# Altium integrated library Weidmueller_OMNIMATE_Power.IntLib: 508 symbols (part 2 of 9) (continued)
## 1047690000 (continued)
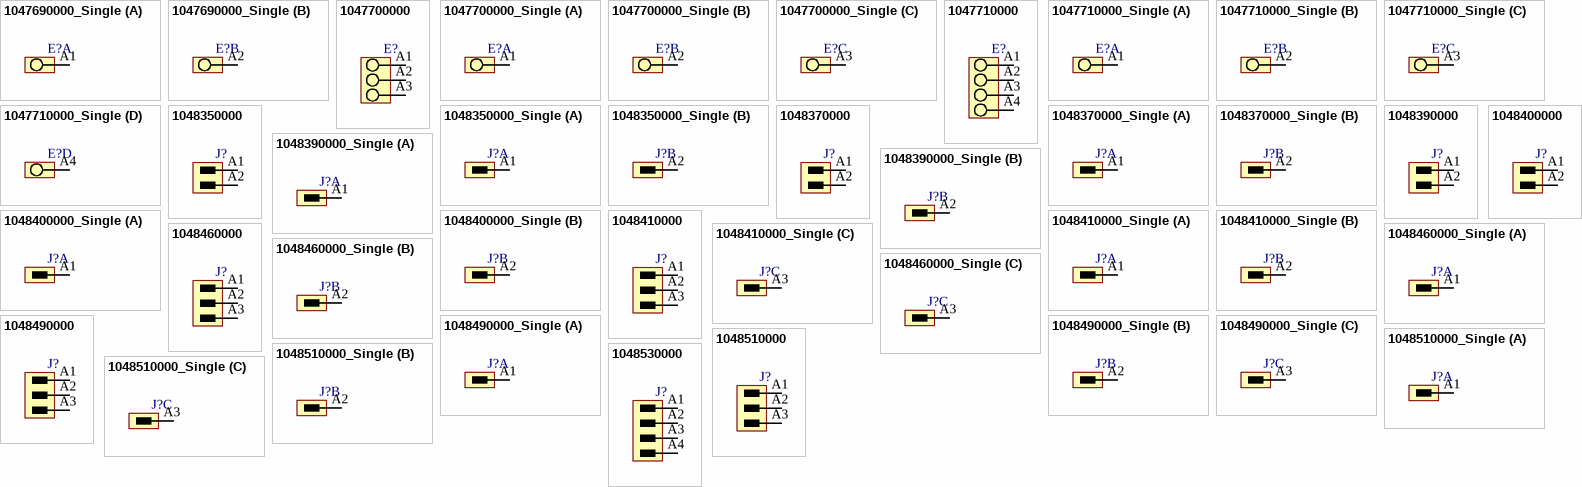
[diagram p4: symbols 1047690000_Single to 1048530000]

## 1047690000_Single
designator E?
OMNIMATE Power - series LXXX; PartNumber: 1047690000; Manufacturer: Weidmueller; Short_text_for_material: LXXX 15.00/02/90FR 4.5SN GY BX; Side_termination_characteristic: Flange right; Mounting_onto_the_PCB: Solder connection; Pitch_mm: 15 mm; Pitch_inch: 0,591 inch; No_of_poles: 2; Solder_pin_length_mm: 4,5 mm; Contact_material: Cu-Leg; Contact_surface: tinned; Insulating_material: Wemid (PA); UL_94_flammability_rating: V-0; Rated_voltage_for_surge_voltage_class_pollution_degree_II_2: 1000 V; Rated_current_min_no_of_poles_TU_20_deg_C: 150 A; Solid_min_H05_07_V_U: 0,5 mm²; Solid_max_H05_07_V_U: 16 mm²; Rated_voltage_use_group_B_UL_1059: 600 V; Rated_current_use_group_B_UL_1059: 127 A; Wire_cross_section_AWG_min_UL_1059: AWG 20; Wire_cross_section_AWG_max_UL_1059: AWG 1; PackageReference: LXXX_15_00_90FR_02; Colour: Pebble grey; Packaging: Box; Qty: 20 PCS; Revision: V1; ComponentLink1Description: Manufacturer URL; ComponentLink1URL: http://www.weidmueller.com/; ComponentLink2Description: URL Link1; ComponentLink2URL: http://catalog.weidmueller.com/catalog/Start.do?localeId=en&ObjectID=1047690000
footprint LXXX_15_00_90FR_02 (OMNIMATE Power - Serie LXXX  LXXX 15.00/02/90FR 4.5)
part A pins: A1
part B pins: A2
1 alternate drawing of the same symbol

## 1047700000
designator E?
OMNIMATE Power - series LXXX; PartNumber: 1047700000; Manufacturer: Weidmueller; Short_text_for_material: LXXX 15.00/03/90FR 4.5SN GY BX; Side_termination_characteristic: Flange right; Mounting_onto_the_PCB: Solder connection; Pitch_mm: 15 mm; Pitch_inch: 0,591 inch; No_of_poles: 3; Solder_pin_length_mm: 4,5 mm; Contact_material: Cu-Leg; Contact_surface: tinned; Insulating_material: Wemid (PA); UL_94_flammability_rating: V-0; Rated_voltage_for_surge_voltage_class_pollution_degree_II_2: 1000 V; Rated_current_min_no_of_poles_TU_20_deg_C: 150 A; Solid_min_H05_07_V_U: 0,5 mm²; Solid_max_H05_07_V_U: 16 mm²; Rated_voltage_use_group_B_UL_1059: 600 V; Rated_current_use_group_B_UL_1059: 127 A; Wire_cross_section_AWG_min_UL_1059: AWG 20; Wire_cross_section_AWG_max_UL_1059: AWG 1; PackageReference: LXXX_15_00_90FR_03; Colour: Pebble grey; Packaging: Box; Qty: 10 PCS; Revision: V1; ComponentLink1Description: Manufacturer URL; ComponentLink1URL: http://www.weidmueller.com/; ComponentLink2Description: URL Link1; ComponentLink2URL: http://catalog.weidmueller.com/catalog/Start.do?localeId=en&ObjectID=1047700000
footprint LXXX_15_00_90FR_03 (OMNIMATE Power - Serie LXXX  LXXX 15.00/03/90FR 4.5)
pins: A1, A2, A3
1 alternate drawing of the same symbol

## 1047700000_Single
designator E?
OMNIMATE Power - series LXXX; PartNumber: 1047700000; Manufacturer: Weidmueller; Short_text_for_material: LXXX 15.00/03/90FR 4.5SN GY BX; Side_termination_characteristic: Flange right; Mounting_onto_the_PCB: Solder connection; Pitch_mm: 15 mm; Pitch_inch: 0,591 inch; No_of_poles: 3; Solder_pin_length_mm: 4,5 mm; Contact_material: Cu-Leg; Contact_surface: tinned; Insulating_material: Wemid (PA); UL_94_flammability_rating: V-0; Rated_voltage_for_surge_voltage_class_pollution_degree_II_2: 1000 V; Rated_current_min_no_of_poles_TU_20_deg_C: 150 A; Solid_min_H05_07_V_U: 0,5 mm²; Solid_max_H05_07_V_U: 16 mm²; Rated_voltage_use_group_B_UL_1059: 600 V; Rated_current_use_group_B_UL_1059: 127 A; Wire_cross_section_AWG_min_UL_1059: AWG 20; Wire_cross_section_AWG_max_UL_1059: AWG 1; PackageReference: LXXX_15_00_90FR_03; Colour: Pebble grey; Packaging: Box; Qty: 10 PCS; Revision: V1; ComponentLink1Description: Manufacturer URL; ComponentLink1URL: http://www.weidmueller.com/; ComponentLink2Description: URL Link1; ComponentLink2URL: http://catalog.weidmueller.com/catalog/Start.do?localeId=en&ObjectID=1047700000
footprint LXXX_15_00_90FR_03 (OMNIMATE Power - Serie LXXX  LXXX 15.00/03/90FR 4.5)
part A pins: A1
part B pins: A2
part C pins: A3
1 alternate drawing of the same symbol

## 1047710000
designator E?
OMNIMATE Power - series LXXX; PartNumber: 1047710000; Manufacturer: Weidmueller; Short_text_for_material: LXXX 15.00/04/90FR 4.5SN GY BX; Side_termination_characteristic: Flange right; Mounting_onto_the_PCB: Solder connection; Pitch_mm: 15 mm; Pitch_inch: 0,591 inch; No_of_poles: 4; Solder_pin_length_mm: 4,5 mm; Contact_material: Cu-Leg; Contact_surface: tinned; Insulating_material: Wemid (PA); UL_94_flammability_rating: V-0; Rated_voltage_for_surge_voltage_class_pollution_degree_II_2: 1000 V; Rated_current_min_no_of_poles_TU_20_deg_C: 150 A; Solid_min_H05_07_V_U: 0,5 mm²; Solid_max_H05_07_V_U: 16 mm²; Rated_voltage_use_group_B_UL_1059: 600 V; Rated_current_use_group_B_UL_1059: 127 A; Wire_cross_section_AWG_min_UL_1059: AWG 20; Wire_cross_section_AWG_max_UL_1059: AWG 1; PackageReference: LXXX_15_00_90FR_04; Colour: Pebble grey; Packaging: Box; Qty: 10 PCS; Revision: V1; ComponentLink1Description: Manufacturer URL; ComponentLink1URL: http://www.weidmueller.com/; ComponentLink2Description: URL Link1; ComponentLink2URL: http://catalog.weidmueller.com/catalog/Start.do?localeId=en&ObjectID=1047710000
footprint LXXX_15_00_90FR_04 (OMNIMATE Power - Serie LXXX  LXXX 15.00/04/90FR 4.5)
pins: A1, A2, A3, A4
1 alternate drawing of the same symbol

## 1047710000_Single
designator E?
OMNIMATE Power - series LXXX; PartNumber: 1047710000; Manufacturer: Weidmueller; Short_text_for_material: LXXX 15.00/04/90FR 4.5SN GY BX; Side_termination_characteristic: Flange right; Mounting_onto_the_PCB: Solder connection; Pitch_mm: 15 mm; Pitch_inch: 0,591 inch; No_of_poles: 4; Solder_pin_length_mm: 4,5 mm; Contact_material: Cu-Leg; Contact_surface: tinned; Insulating_material: Wemid (PA); UL_94_flammability_rating: V-0; Rated_voltage_for_surge_voltage_class_pollution_degree_II_2: 1000 V; Rated_current_min_no_of_poles_TU_20_deg_C: 150 A; Solid_min_H05_07_V_U: 0,5 mm²; Solid_max_H05_07_V_U: 16 mm²; Rated_voltage_use_group_B_UL_1059: 600 V; Rated_current_use_group_B_UL_1059: 127 A; Wire_cross_section_AWG_min_UL_1059: AWG 20; Wire_cross_section_AWG_max_UL_1059: AWG 1; PackageReference: LXXX_15_00_90FR_04; Colour: Pebble grey; Packaging: Box; Qty: 10 PCS; Revision: V1; ComponentLink1Description: Manufacturer URL; ComponentLink1URL: http://www.weidmueller.com/; ComponentLink2Description: URL Link1; ComponentLink2URL: http://catalog.weidmueller.com/catalog/Start.do?localeId=en&ObjectID=1047710000
footprint LXXX_15_00_90FR_04 (OMNIMATE Power - Serie LXXX  LXXX 15.00/04/90FR 4.5)
part A pins: A1
part B pins: A2
part C pins: A3
part D pins: A4
1 alternate drawing of the same symbol

## 1048350000
designator J?
OMNIMATE Power - series BV/SV 7.62HP; PartNumber: 1048350000; Manufacturer: Weidmueller; Short_text_for_material: SV 7.62HP/02/180MF2 3.5SN BK BX; Side_termination_characteristic: closed side; Note: Middle flange; Mounting_onto_the_PCB: Solder connection; Pitch_mm: 7.62 mm; Pitch_inch: 0.3 inch; No_of_poles: 2; Outgoing_elbow: 180°; Solder_pin_length_mm: 3.5 mm; Contact_material: Cu-Leg; Contact_surface: tinned; Insulating_material: PA GF; UL_94_flammability_rating: V-0; Rated_voltage_for_surge_voltage_class_pollution_degree_II_2: 1000 V; Rated_voltage_use_group_B_UL_1059: 300 V; Rated_current_use_group_B_UL_1059: 40.5 A; PackageReference: SV_7_62HP_180MF_02; Colour: Black; Packaging: Box; Qty: 78 PCS; Revision: V1; ComponentLink1Description: Manufacturer URL; ComponentLink1URL: http://www.weidmueller.com/; ComponentLink2Description: URL Link1; ComponentLink2URL: http://catalog.weidmueller.com/catalog/Start.do?localeId=en&ObjectID=1048350000
footprint SV_7_62HP_180MF_02 (OMNIMATE Power - Serie BV/SV 7.62HP  SV 7.62HP/02/180MF3 3.5)
pins: A1, A2

## 1048350000_Single
designator J?
OMNIMATE Power - series BV/SV 7.62HP; PartNumber: 1048350000; Manufacturer: Weidmueller; Short_text_for_material: SV 7.62HP/02/180MF2 3.5SN BK BX; Side_termination_characteristic: closed side; Note: Middle flange; Mounting_onto_the_PCB: Solder connection; Pitch_mm: 7.62 mm; Pitch_inch: 0.3 inch; No_of_poles: 2; Outgoing_elbow: 180°; Solder_pin_length_mm: 3.5 mm; Contact_material: Cu-Leg; Contact_surface: tinned; Insulating_material: PA GF; UL_94_flammability_rating: V-0; Rated_voltage_for_surge_voltage_class_pollution_degree_II_2: 1000 V; Rated_voltage_use_group_B_UL_1059: 300 V; Rated_current_use_group_B_UL_1059: 40.5 A; PackageReference: SV_7_62HP_180MF_02; Colour: Black; Packaging: Box; Qty: 78 PCS; Revision: V1; ComponentLink1Description: Manufacturer URL; ComponentLink1URL: http://www.weidmueller.com/; ComponentLink2Description: URL Link1; ComponentLink2URL: http://catalog.weidmueller.com/catalog/Start.do?localeId=en&ObjectID=1048350000
footprint SV_7_62HP_180MF_02 (OMNIMATE Power - Serie BV/SV 7.62HP  SV 7.62HP/02/180MF3 3.5)
part A pins: A1
part B pins: A2

## 1048370000
designator J?
OMNIMATE Power - series BV/SV 7.62HP; PartNumber: 1048370000; Manufacturer: Weidmueller; Short_text_for_material: SV 7.62HP/02/270MF2 3.5SN BK BX; Side_termination_characteristic: closed side; Note: Middle flange; Mounting_onto_the_PCB: Solder connection; Pitch_mm: 7.62 mm; Pitch_inch: 0.3 inch; No_of_poles: 2; Outgoing_elbow: 270°; Solder_pin_length_mm: 3.5 mm; Contact_material: Cu-Leg; Contact_surface: tinned; Insulating_material: PA GF; UL_94_flammability_rating: V-0; Rated_voltage_for_surge_voltage_class_pollution_degree_II_2: 1000 V; Rated_voltage_use_group_B_UL_1059: 300 V; Rated_current_use_group_B_UL_1059: 40.5 A; PackageReference: SV_7_62HP_270MF_02; Colour: Black; Packaging: Box; Qty: 78 PCS; Revision: V1; ComponentLink1Description: Manufacturer URL; ComponentLink1URL: http://www.weidmueller.com/; ComponentLink2Description: URL Link1; ComponentLink2URL: http://catalog.weidmueller.com/catalog/Start.do?localeId=en&ObjectID=1048370000
footprint SV_7_62HP_270MF_02 (OMNIMATE Power - Serie BV/SV 7.62HP  SV 7.62HP/02/270MF3 3.5)
pins: A1, A2

## 1048370000_Single
designator J?
OMNIMATE Power - series BV/SV 7.62HP; PartNumber: 1048370000; Manufacturer: Weidmueller; Short_text_for_material: SV 7.62HP/02/270MF2 3.5SN BK BX; Side_termination_characteristic: closed side; Note: Middle flange; Mounting_onto_the_PCB: Solder connection; Pitch_mm: 7.62 mm; Pitch_inch: 0.3 inch; No_of_poles: 2; Outgoing_elbow: 270°; Solder_pin_length_mm: 3.5 mm; Contact_material: Cu-Leg; Contact_surface: tinned; Insulating_material: PA GF; UL_94_flammability_rating: V-0; Rated_voltage_for_surge_voltage_class_pollution_degree_II_2: 1000 V; Rated_voltage_use_group_B_UL_1059: 300 V; Rated_current_use_group_B_UL_1059: 40.5 A; PackageReference: SV_7_62HP_270MF_02; Colour: Black; Packaging: Box; Qty: 78 PCS; Revision: V1; ComponentLink1Description: Manufacturer URL; ComponentLink1URL: http://www.weidmueller.com/; ComponentLink2Description: URL Link1; ComponentLink2URL: http://catalog.weidmueller.com/catalog/Start.do?localeId=en&ObjectID=1048370000
footprint SV_7_62HP_270MF_02 (OMNIMATE Power - Serie BV/SV 7.62HP  SV 7.62HP/02/270MF3 3.5)
part A pins: A1
part B pins: A2

## 1048390000
designator J?
OMNIMATE Power - series BV/SV 7.62HP; PartNumber: 1048390000; Manufacturer: Weidmueller; Short_text_for_material: SV 7.62HP/02/90MF2 3.5SN BK BX; Side_termination_characteristic: closed side; Note: Middle flange; Mounting_onto_the_PCB: Solder connection; Pitch_mm: 7.62 mm; Pitch_inch: 0.3 inch; No_of_poles: 2; Outgoing_elbow: 90°; Solder_pin_length_mm: 3.5 mm; Contact_material: Cu-Leg; Contact_surface: tinned; Insulating_material: PA GF; UL_94_flammability_rating: V-0; Rated_voltage_for_surge_voltage_class_pollution_degree_II_2: 1000 V; Rated_voltage_use_group_B_UL_1059: 300 V; Rated_current_use_group_B_UL_1059: 40.5 A; PackageReference: SV_7_62HP_90MF_02; Colour: Black; Packaging: Box; Qty: 78 PCS; Revision: V1; ComponentLink1Description: Manufacturer URL; ComponentLink1URL: http://www.weidmueller.com/; ComponentLink2Description: URL Link1; ComponentLink2URL: http://catalog.weidmueller.com/catalog/Start.do?localeId=en&ObjectID=1048390000
footprint SV_7_62HP_90MF_02 (OMNIMATE Power - Serie BV/SV 7.62HP  SV 7.62HP/02/90MF3 3.5)
pins: A1, A2

## 1048390000_Single
designator J?
OMNIMATE Power - series BV/SV 7.62HP; PartNumber: 1048390000; Manufacturer: Weidmueller; Short_text_for_material: SV 7.62HP/02/90MF2 3.5SN BK BX; Side_termination_characteristic: closed side; Note: Middle flange; Mounting_onto_the_PCB: Solder connection; Pitch_mm: 7.62 mm; Pitch_inch: 0.3 inch; No_of_poles: 2; Outgoing_elbow: 90°; Solder_pin_length_mm: 3.5 mm; Contact_material: Cu-Leg; Contact_surface: tinned; Insulating_material: PA GF; UL_94_flammability_rating: V-0; Rated_voltage_for_surge_voltage_class_pollution_degree_II_2: 1000 V; Rated_voltage_use_group_B_UL_1059: 300 V; Rated_current_use_group_B_UL_1059: 40.5 A; PackageReference: SV_7_62HP_90MF_02; Colour: Black; Packaging: Box; Qty: 78 PCS; Revision: V1; ComponentLink1Description: Manufacturer URL; ComponentLink1URL: http://www.weidmueller.com/; ComponentLink2Description: URL Link1; ComponentLink2URL: http://catalog.weidmueller.com/catalog/Start.do?localeId=en&ObjectID=1048390000
footprint SV_7_62HP_90MF_02 (OMNIMATE Power - Serie BV/SV 7.62HP  SV 7.62HP/02/90MF3 3.5)
part A pins: A1
part B pins: A2

## 1048400000
designator J?
OMNIMATE Power - series BV/SV 7.62HP; PartNumber: 1048400000; Manufacturer: Weidmueller; Short_text_for_material: SV 7.62HP/02/90MSF 3.5SN BK BX; Side_termination_characteristic: closed side; Note: Middle screw flange; Mounting_onto_the_PCB: Solder connection; Pitch_mm: 7.62 mm; Pitch_inch: 0.3 inch; No_of_poles: 2; Outgoing_elbow: 90°; Solder_pin_length_mm: 3.5 mm; Contact_material: Cu-Leg; Contact_surface: tinned; Insulating_material: PA GF; UL_94_flammability_rating: V-0; Rated_voltage_for_surge_voltage_class_pollution_degree_II_2: 1000 V; Rated_voltage_use_group_B_UL_1059: 300 V; Rated_current_use_group_B_UL_1059: 40.5 A; PackageReference: SV_7_62HP_90MSF_02; Colour: Black; Packaging: Box; Qty: 78 PCS; Revision: V1; ComponentLink1Description: Manufacturer URL; ComponentLink1URL: http://www.weidmueller.com/; ComponentLink2Description: URL Link1; ComponentLink2URL: http://catalog.weidmueller.com/catalog/Start.do?localeId=en&ObjectID=1048400000
footprint SV_7_62HP_90MSF_02 (OMNIMATE Power - Serie BV/SV 7.62HP  SV 7.62HP/02/90MSF3 3.5)
pins: A1, A2

## 1048400000_Single
designator J?
OMNIMATE Power - series BV/SV 7.62HP; PartNumber: 1048400000; Manufacturer: Weidmueller; Short_text_for_material: SV 7.62HP/02/90MSF 3.5SN BK BX; Side_termination_characteristic: closed side; Note: Middle screw flange; Mounting_onto_the_PCB: Solder connection; Pitch_mm: 7.62 mm; Pitch_inch: 0.3 inch; No_of_poles: 2; Outgoing_elbow: 90°; Solder_pin_length_mm: 3.5 mm; Contact_material: Cu-Leg; Contact_surface: tinned; Insulating_material: PA GF; UL_94_flammability_rating: V-0; Rated_voltage_for_surge_voltage_class_pollution_degree_II_2: 1000 V; Rated_voltage_use_group_B_UL_1059: 300 V; Rated_current_use_group_B_UL_1059: 40.5 A; PackageReference: SV_7_62HP_90MSF_02; Colour: Black; Packaging: Box; Qty: 78 PCS; Revision: V1; ComponentLink1Description: Manufacturer URL; ComponentLink1URL: http://www.weidmueller.com/; ComponentLink2Description: URL Link1; ComponentLink2URL: http://catalog.weidmueller.com/catalog/Start.do?localeId=en&ObjectID=1048400000
footprint SV_7_62HP_90MSF_02 (OMNIMATE Power - Serie BV/SV 7.62HP  SV 7.62HP/02/90MSF3 3.5)
part A pins: A1
part B pins: A2

## 1048410000
designator J?
OMNIMATE Power - series BV/SV 7.62HP; PartNumber: 1048410000; Manufacturer: Weidmueller; Short_text_for_material: SV 7.62HP/03/180MF2 3.5SN BK BX; Side_termination_characteristic: closed side; Note: Middle flange; Mounting_onto_the_PCB: Solder connection; Pitch_mm: 7.62 mm; Pitch_inch: 0.3 inch; No_of_poles: 3; Outgoing_elbow: 180°; Solder_pin_length_mm: 3.5 mm; Contact_material: Cu-Leg; Contact_surface: tinned; Insulating_material: PA GF; UL_94_flammability_rating: V-0; Rated_voltage_for_surge_voltage_class_pollution_degree_II_2: 1000 V; Rated_voltage_use_group_B_UL_1059: 300 V; Rated_current_use_group_B_UL_1059: 40.5 A; PackageReference: SV_7_62HP_180MF_03; Colour: Black; Packaging: Box; Qty: 60 PCS; Revision: V1; ComponentLink1Description: Manufacturer URL; ComponentLink1URL: http://www.weidmueller.com/; ComponentLink2Description: URL Link1; ComponentLink2URL: http://catalog.weidmueller.com/catalog/Start.do?localeId=en&ObjectID=1048410000
footprint SV_7_62HP_180MF_03 (OMNIMATE Power - Serie BV/SV 7.62HP  SV 7.62HP/03/180MF3 3.5)
pins: A1, A2, A3

## 1048410000_Single
designator J?
OMNIMATE Power - series BV/SV 7.62HP; PartNumber: 1048410000; Manufacturer: Weidmueller; Short_text_for_material: SV 7.62HP/03/180MF2 3.5SN BK BX; Side_termination_characteristic: closed side; Note: Middle flange; Mounting_onto_the_PCB: Solder connection; Pitch_mm: 7.62 mm; Pitch_inch: 0.3 inch; No_of_poles: 3; Outgoing_elbow: 180°; Solder_pin_length_mm: 3.5 mm; Contact_material: Cu-Leg; Contact_surface: tinned; Insulating_material: PA GF; UL_94_flammability_rating: V-0; Rated_voltage_for_surge_voltage_class_pollution_degree_II_2: 1000 V; Rated_voltage_use_group_B_UL_1059: 300 V; Rated_current_use_group_B_UL_1059: 40.5 A; PackageReference: SV_7_62HP_180MF_03; Colour: Black; Packaging: Box; Qty: 60 PCS; Revision: V1; ComponentLink1Description: Manufacturer URL; ComponentLink1URL: http://www.weidmueller.com/; ComponentLink2Description: URL Link1; ComponentLink2URL: http://catalog.weidmueller.com/catalog/Start.do?localeId=en&ObjectID=1048410000
footprint SV_7_62HP_180MF_03 (OMNIMATE Power - Serie BV/SV 7.62HP  SV 7.62HP/03/180MF3 3.5)
part A pins: A1
part B pins: A2
part C pins: A3

## 1048460000
designator J?
OMNIMATE Power - series BV/SV 7.62HP; PartNumber: 1048460000; Manufacturer: Weidmueller; Short_text_for_material: SV 7.62HP/03/270MF3 3.5SN BK BX; Side_termination_characteristic: closed side; Note: Middle flange; Mounting_onto_the_PCB: Solder connection; Pitch_mm: 7.62 mm; Pitch_inch: 0.3 inch; No_of_poles: 3; Outgoing_elbow: 270°; Solder_pin_length_mm: 3.5 mm; Contact_material: Cu-Leg; Contact_surface: tinned; Insulating_material: PA GF; UL_94_flammability_rating: V-0; Rated_voltage_for_surge_voltage_class_pollution_degree_II_2: 1000 V; Rated_voltage_use_group_B_UL_1059: 300 V; Rated_current_use_group_B_UL_1059: 40.5 A; PackageReference: SV_7_62HP_270MF_03; Colour: Black; Packaging: Box; Qty: 60 PCS; Revision: V1; ComponentLink1Description: Manufacturer URL; ComponentLink1URL: http://www.weidmueller.com/; ComponentLink2Description: URL Link1; ComponentLink2URL: http://catalog.weidmueller.com/catalog/Start.do?localeId=en&ObjectID=1048460000
footprint SV_7_62HP_270MF_03 (OMNIMATE Power - Serie BV/SV 7.62HP  SV 7.62HP/03/270MF3 3.5)
pins: A1, A2, A3

## 1048460000_Single
designator J?
OMNIMATE Power - series BV/SV 7.62HP; PartNumber: 1048460000; Manufacturer: Weidmueller; Short_text_for_material: SV 7.62HP/03/270MF3 3.5SN BK BX; Side_termination_characteristic: closed side; Note: Middle flange; Mounting_onto_the_PCB: Solder connection; Pitch_mm: 7.62 mm; Pitch_inch: 0.3 inch; No_of_poles: 3; Outgoing_elbow: 270°; Solder_pin_length_mm: 3.5 mm; Contact_material: Cu-Leg; Contact_surface: tinned; Insulating_material: PA GF; UL_94_flammability_rating: V-0; Rated_voltage_for_surge_voltage_class_pollution_degree_II_2: 1000 V; Rated_voltage_use_group_B_UL_1059: 300 V; Rated_current_use_group_B_UL_1059: 40.5 A; PackageReference: SV_7_62HP_270MF_03; Colour: Black; Packaging: Box; Qty: 60 PCS; Revision: V1; ComponentLink1Description: Manufacturer URL; ComponentLink1URL: http://www.weidmueller.com/; ComponentLink2Description: URL Link1; ComponentLink2URL: http://catalog.weidmueller.com/catalog/Start.do?localeId=en&ObjectID=1048460000
footprint SV_7_62HP_270MF_03 (OMNIMATE Power - Serie BV/SV 7.62HP  SV 7.62HP/03/270MF3 3.5)
part A pins: A1
part B pins: A2
part C pins: A3

## 1048490000
designator J?
OMNIMATE Power - series BV/SV 7.62HP; PartNumber: 1048490000; Manufacturer: Weidmueller; Short_text_for_material: SV 7.62HP/03/90MF2 3.5SN BK BX; Side_termination_characteristic: closed side; Note: Middle flange; Mounting_onto_the_PCB: Solder connection; Pitch_mm: 7.62 mm; Pitch_inch: 0.3 inch; No_of_poles: 3; Outgoing_elbow: 90°; Solder_pin_length_mm: 3.5 mm; Contact_material: Cu-Leg; Contact_surface: tinned; Insulating_material: PA GF; UL_94_flammability_rating: V-0; Rated_voltage_for_surge_voltage_class_pollution_degree_II_2: 1000 V; Rated_voltage_use_group_B_UL_1059: 300 V; Rated_current_use_group_B_UL_1059: 40.5 A; PackageReference: SV_7_62HP_90MF_03; Colour: Black; Packaging: Box; Qty: 60 PCS; Revision: V1; ComponentLink1Description: Manufacturer URL; ComponentLink1URL: http://www.weidmueller.com/; ComponentLink2Description: URL Link1; ComponentLink2URL: http://catalog.weidmueller.com/catalog/Start.do?localeId=en&ObjectID=1048490000
footprint SV_7_62HP_90MF_03 (OMNIMATE Power - Serie BV/SV 7.62HP  SV 7.62HP/03/90MF3 3.5)
pins: A1, A2, A3

## 1048490000_Single
designator J?
OMNIMATE Power - series BV/SV 7.62HP; PartNumber: 1048490000; Manufacturer: Weidmueller; Short_text_for_material: SV 7.62HP/03/90MF2 3.5SN BK BX; Side_termination_characteristic: closed side; Note: Middle flange; Mounting_onto_the_PCB: Solder connection; Pitch_mm: 7.62 mm; Pitch_inch: 0.3 inch; No_of_poles: 3; Outgoing_elbow: 90°; Solder_pin_length_mm: 3.5 mm; Contact_material: Cu-Leg; Contact_surface: tinned; Insulating_material: PA GF; UL_94_flammability_rating: V-0; Rated_voltage_for_surge_voltage_class_pollution_degree_II_2: 1000 V; Rated_voltage_use_group_B_UL_1059: 300 V; Rated_current_use_group_B_UL_1059: 40.5 A; PackageReference: SV_7_62HP_90MF_03; Colour: Black; Packaging: Box; Qty: 60 PCS; Revision: V1; ComponentLink1Description: Manufacturer URL; ComponentLink1URL: http://www.weidmueller.com/; ComponentLink2Description: URL Link1; ComponentLink2URL: http://catalog.weidmueller.com/catalog/Start.do?localeId=en&ObjectID=1048490000
footprint SV_7_62HP_90MF_03 (OMNIMATE Power - Serie BV/SV 7.62HP  SV 7.62HP/03/90MF3 3.5)
part A pins: A1
part B pins: A2
part C pins: A3

## 1048510000
designator J?
OMNIMATE Power - series BV/SV 7.62HP; PartNumber: 1048510000; Manufacturer: Weidmueller; Short_text_for_material: SV 7.62HP/03/90MSF2 3.5SN BK BX; Side_termination_characteristic: closed side; Note: Middle screw flange; Mounting_onto_the_PCB: Solder connection; Pitch_mm: 7.62 mm; Pitch_inch: 0.3 inch; No_of_poles: 3; Outgoing_elbow: 90°; Solder_pin_length_mm: 3.5 mm; Contact_material: Cu-Leg; Contact_surface: tinned; Insulating_material: PA GF; UL_94_flammability_rating: V-0; Rated_voltage_for_surge_voltage_class_pollution_degree_II_2: 1000 V; Rated_voltage_use_group_B_UL_1059: 300 V; Rated_current_use_group_B_UL_1059: 40.5 A; PackageReference: SV_7_62HP_90MSF_03; Colour: Black; Packaging: Box; Qty: 60 PCS; Revision: V1; ComponentLink1Description: Manufacturer URL; ComponentLink1URL: http://www.weidmueller.com/; ComponentLink2Description: URL Link1; ComponentLink2URL: http://catalog.weidmueller.com/catalog/Start.do?localeId=en&ObjectID=1048510000
footprint SV_7_62HP_90MSF_03 (OMNIMATE Power - Serie BV/SV 7.62HP  SV 7.62HP/03/90MSF3 3.5)
pins: A1, A2, A3

## 1048510000_Single
designator J?
OMNIMATE Power - series BV/SV 7.62HP; PartNumber: 1048510000; Manufacturer: Weidmueller; Short_text_for_material: SV 7.62HP/03/90MSF2 3.5SN BK BX; Side_termination_characteristic: closed side; Note: Middle screw flange; Mounting_onto_the_PCB: Solder connection; Pitch_mm: 7.62 mm; Pitch_inch: 0.3 inch; No_of_poles: 3; Outgoing_elbow: 90°; Solder_pin_length_mm: 3.5 mm; Contact_material: Cu-Leg; Contact_surface: tinned; Insulating_material: PA GF; UL_94_flammability_rating: V-0; Rated_voltage_for_surge_voltage_class_pollution_degree_II_2: 1000 V; Rated_voltage_use_group_B_UL_1059: 300 V; Rated_current_use_group_B_UL_1059: 40.5 A; PackageReference: SV_7_62HP_90MSF_03; Colour: Black; Packaging: Box; Qty: 60 PCS; Revision: V1; ComponentLink1Description: Manufacturer URL; ComponentLink1URL: http://www.weidmueller.com/; ComponentLink2Description: URL Link1; ComponentLink2URL: http://catalog.weidmueller.com/catalog/Start.do?localeId=en&ObjectID=1048510000
footprint SV_7_62HP_90MSF_03 (OMNIMATE Power - Serie BV/SV 7.62HP  SV 7.62HP/03/90MSF3 3.5)
part A pins: A1
part B pins: A2
part C pins: A3

## 1048530000
designator J?
OMNIMATE Power - series BV/SV 7.62HP; PartNumber: 1048530000; Manufacturer: Weidmueller; Short_text_for_material: SV 7.62HP/04/180MF3 3.5SN BK BX; Side_termination_characteristic: closed side; Note: Middle flange; Mounting_onto_the_PCB: Solder connection; Pitch_mm: 7.62 mm; Pitch_inch: 0.3 inch; No_of_poles: 4; Outgoing_elbow: 180°; Solder_pin_length_mm: 3.5 mm; Contact_material: Cu-Leg; Contact_surface: tinned; Insulating_material: PA GF; UL_94_flammability_rating: V-0; Rated_voltage_for_surge_voltage_class_pollution_degree_II_2: 1000 V; Rated_voltage_use_group_B_UL_1059: 300 V; Rated_current_use_group_B_UL_1059: 40.5 A; PackageReference: SV_7_62HP_180MF_04; Colour: Black; Packaging: Box; Qty: 48 PCS; Revision: V1; ComponentLink1Description: Manufacturer URL; ComponentLink1URL: http://www.weidmueller.com/; ComponentLink2Description: URL Link1; ComponentLink2URL: http://catalog.weidmueller.com/catalog/Start.do?localeId=en&ObjectID=1048530000
footprint SV_7_62HP_180MF_04 (OMNIMATE Power - Serie BV/SV 7.62HP  SV 7.62HP/04/180MF3 3.5)
pins: A1, A2, A3, A4

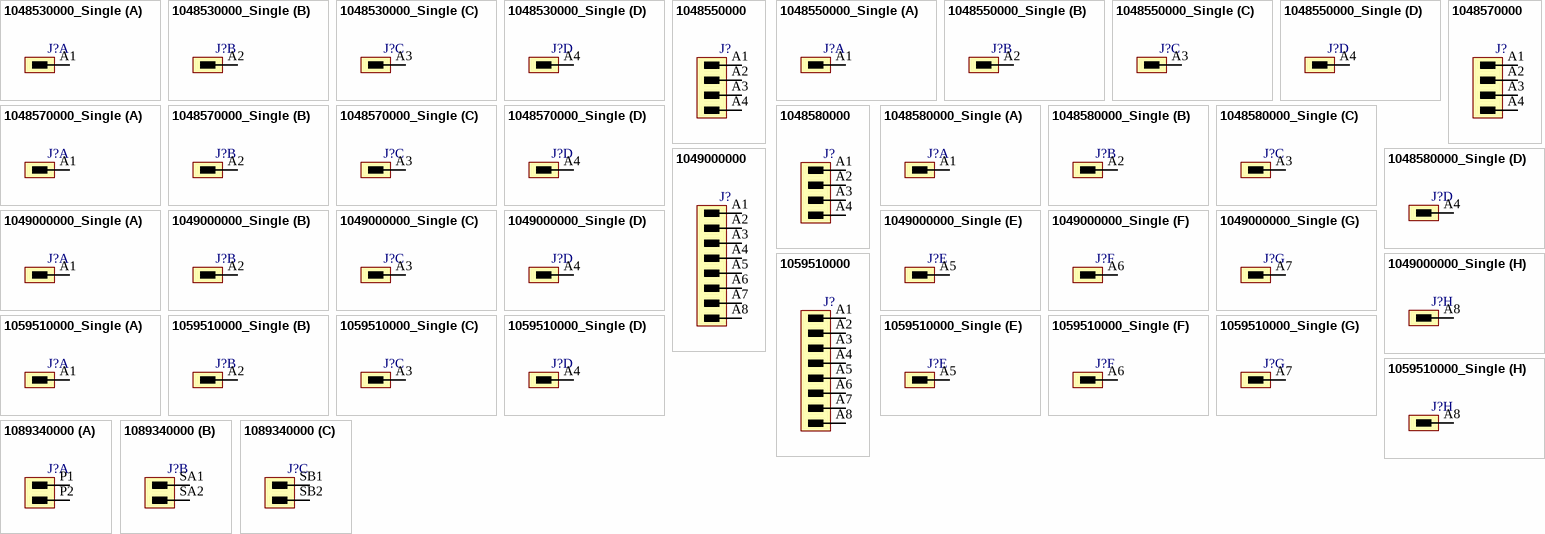
[diagram p5: symbols 1048530000_Single to 1089340000]

## 1048530000_Single
designator J?
OMNIMATE Power - series BV/SV 7.62HP; PartNumber: 1048530000; Manufacturer: Weidmueller; Short_text_for_material: SV 7.62HP/04/180MF3 3.5SN BK BX; Side_termination_characteristic: closed side; Note: Middle flange; Mounting_onto_the_PCB: Solder connection; Pitch_mm: 7.62 mm; Pitch_inch: 0.3 inch; No_of_poles: 4; Outgoing_elbow: 180°; Solder_pin_length_mm: 3.5 mm; Contact_material: Cu-Leg; Contact_surface: tinned; Insulating_material: PA GF; UL_94_flammability_rating: V-0; Rated_voltage_for_surge_voltage_class_pollution_degree_II_2: 1000 V; Rated_voltage_use_group_B_UL_1059: 300 V; Rated_current_use_group_B_UL_1059: 40.5 A; PackageReference: SV_7_62HP_180MF_04; Colour: Black; Packaging: Box; Qty: 48 PCS; Revision: V1; ComponentLink1Description: Manufacturer URL; ComponentLink1URL: http://www.weidmueller.com/; ComponentLink2Description: URL Link1; ComponentLink2URL: http://catalog.weidmueller.com/catalog/Start.do?localeId=en&ObjectID=1048530000
footprint SV_7_62HP_180MF_04 (OMNIMATE Power - Serie BV/SV 7.62HP  SV 7.62HP/04/180MF3 3.5)
part A pins: A1
part B pins: A2
part C pins: A3
part D pins: A4

## 1048550000
designator J?
OMNIMATE Power - series BV/SV 7.62HP; PartNumber: 1048550000; Manufacturer: Weidmueller; Short_text_for_material: SV 7.62HP/04/270MF3 3.5SN BK BX; Side_termination_characteristic: closed side; Note: Middle flange; Mounting_onto_the_PCB: Solder connection; Pitch_mm: 7.62 mm; Pitch_inch: 0.3 inch; No_of_poles: 4; Outgoing_elbow: 270°; Solder_pin_length_mm: 3.5 mm; Contact_material: Cu-Leg; Contact_surface: tinned; Insulating_material: PA GF; UL_94_flammability_rating: V-0; Rated_voltage_for_surge_voltage_class_pollution_degree_II_2: 1000 V; Rated_voltage_use_group_B_UL_1059: 300 V; Rated_current_use_group_B_UL_1059: 40.5 A; PackageReference: SV_7_62HP_270MF_04; Colour: Black; Packaging: Box; Qty: 48 PCS; Revision: V1; ComponentLink1Description: Manufacturer URL; ComponentLink1URL: http://www.weidmueller.com/; ComponentLink2Description: URL Link1; ComponentLink2URL: http://catalog.weidmueller.com/catalog/Start.do?localeId=en&ObjectID=1048550000
footprint SV_7_62HP_270MF_04 (OMNIMATE Power - Serie BV/SV 7.62HP  SV 7.62HP/04/270MF3 3.5)
pins: A1, A2, A3, A4

## 1048550000_Single
designator J?
OMNIMATE Power - series BV/SV 7.62HP; PartNumber: 1048550000; Manufacturer: Weidmueller; Short_text_for_material: SV 7.62HP/04/270MF3 3.5SN BK BX; Side_termination_characteristic: closed side; Note: Middle flange; Mounting_onto_the_PCB: Solder connection; Pitch_mm: 7.62 mm; Pitch_inch: 0.3 inch; No_of_poles: 4; Outgoing_elbow: 270°; Solder_pin_length_mm: 3.5 mm; Contact_material: Cu-Leg; Contact_surface: tinned; Insulating_material: PA GF; UL_94_flammability_rating: V-0; Rated_voltage_for_surge_voltage_class_pollution_degree_II_2: 1000 V; Rated_voltage_use_group_B_UL_1059: 300 V; Rated_current_use_group_B_UL_1059: 40.5 A; PackageReference: SV_7_62HP_270MF_04; Colour: Black; Packaging: Box; Qty: 48 PCS; Revision: V1; ComponentLink1Description: Manufacturer URL; ComponentLink1URL: http://www.weidmueller.com/; ComponentLink2Description: URL Link1; ComponentLink2URL: http://catalog.weidmueller.com/catalog/Start.do?localeId=en&ObjectID=1048550000
footprint SV_7_62HP_270MF_04 (OMNIMATE Power - Serie BV/SV 7.62HP  SV 7.62HP/04/270MF3 3.5)
part A pins: A1
part B pins: A2
part C pins: A3
part D pins: A4

## 1048570000
designator J?
OMNIMATE Power - series BV/SV 7.62HP; PartNumber: 1048570000; Manufacturer: Weidmueller; Short_text_for_material: SV 7.62HP/04/90MF3 3.5SN BK BX; Side_termination_characteristic: closed side; Note: Middle flange; Mounting_onto_the_PCB: Solder connection; Pitch_mm: 7.62 mm; Pitch_inch: 0.3 inch; No_of_poles: 4; Outgoing_elbow: 90°; Solder_pin_length_mm: 3.5 mm; Contact_material: Cu-Leg; Contact_surface: tinned; Insulating_material: PA GF; UL_94_flammability_rating: V-0; Rated_voltage_for_surge_voltage_class_pollution_degree_II_2: 1000 V; Rated_voltage_use_group_B_UL_1059: 300 V; Rated_current_use_group_B_UL_1059: 40.5 A; PackageReference: SV_7_62HP_90MF_04; Colour: Black; Packaging: Box; Qty: 48 PCS; Revision: V1; ComponentLink1Description: Manufacturer URL; ComponentLink1URL: http://www.weidmueller.com/; ComponentLink2Description: URL Link1; ComponentLink2URL: http://catalog.weidmueller.com/catalog/Start.do?localeId=en&ObjectID=1048570000
footprint SV_7_62HP_90MF_04 (OMNIMATE Power - Serie BV/SV 7.62HP  SV 7.62HP/04/90MF3 3.5)
pins: A1, A2, A3, A4

## 1048570000_Single
designator J?
OMNIMATE Power - series BV/SV 7.62HP; PartNumber: 1048570000; Manufacturer: Weidmueller; Short_text_for_material: SV 7.62HP/04/90MF3 3.5SN BK BX; Side_termination_characteristic: closed side; Note: Middle flange; Mounting_onto_the_PCB: Solder connection; Pitch_mm: 7.62 mm; Pitch_inch: 0.3 inch; No_of_poles: 4; Outgoing_elbow: 90°; Solder_pin_length_mm: 3.5 mm; Contact_material: Cu-Leg; Contact_surface: tinned; Insulating_material: PA GF; UL_94_flammability_rating: V-0; Rated_voltage_for_surge_voltage_class_pollution_degree_II_2: 1000 V; Rated_voltage_use_group_B_UL_1059: 300 V; Rated_current_use_group_B_UL_1059: 40.5 A; PackageReference: SV_7_62HP_90MF_04; Colour: Black; Packaging: Box; Qty: 48 PCS; Revision: V1; ComponentLink1Description: Manufacturer URL; ComponentLink1URL: http://www.weidmueller.com/; ComponentLink2Description: URL Link1; ComponentLink2URL: http://catalog.weidmueller.com/catalog/Start.do?localeId=en&ObjectID=1048570000
footprint SV_7_62HP_90MF_04 (OMNIMATE Power - Serie BV/SV 7.62HP  SV 7.62HP/04/90MF3 3.5)
part A pins: A1
part B pins: A2
part C pins: A3
part D pins: A4

## 1048580000
designator J?
OMNIMATE Power - series BV/SV 7.62HP; PartNumber: 1048580000; Manufacturer: Weidmueller; Short_text_for_material: SV 7.62HP/04/90MSF3 3.5SN BK BX; Side_termination_characteristic: closed side; Note: Middle screw flange; Mounting_onto_the_PCB: Solder connection; Pitch_mm: 7.62 mm; Pitch_inch: 0.3 inch; No_of_poles: 4; Outgoing_elbow: 90°; Solder_pin_length_mm: 3.5 mm; Contact_material: Cu-Leg; Contact_surface: tinned; Insulating_material: PA GF; UL_94_flammability_rating: V-0; Rated_voltage_for_surge_voltage_class_pollution_degree_II_2: 1000 V; Rated_voltage_use_group_B_UL_1059: 300 V; Rated_current_use_group_B_UL_1059: 40.5 A; PackageReference: SV_7_62HP_90MSF_04; Colour: Black; Packaging: Box; Qty: 48 PCS; Revision: V1; ComponentLink1Description: Manufacturer URL; ComponentLink1URL: http://www.weidmueller.com/; ComponentLink2Description: URL Link1; ComponentLink2URL: http://catalog.weidmueller.com/catalog/Start.do?localeId=en&ObjectID=1048580000
footprint SV_7_62HP_90MSF_04 (OMNIMATE Power - Serie BV/SV 7.62HP  SV 7.62HP/04/90MSF3 3.5)
pins: A1, A2, A3, A4

## 1048580000_Single
designator J?
OMNIMATE Power - series BV/SV 7.62HP; PartNumber: 1048580000; Manufacturer: Weidmueller; Short_text_for_material: SV 7.62HP/04/90MSF3 3.5SN BK BX; Side_termination_characteristic: closed side; Note: Middle screw flange; Mounting_onto_the_PCB: Solder connection; Pitch_mm: 7.62 mm; Pitch_inch: 0.3 inch; No_of_poles: 4; Outgoing_elbow: 90°; Solder_pin_length_mm: 3.5 mm; Contact_material: Cu-Leg; Contact_surface: tinned; Insulating_material: PA GF; UL_94_flammability_rating: V-0; Rated_voltage_for_surge_voltage_class_pollution_degree_II_2: 1000 V; Rated_voltage_use_group_B_UL_1059: 300 V; Rated_current_use_group_B_UL_1059: 40.5 A; PackageReference: SV_7_62HP_90MSF_04; Colour: Black; Packaging: Box; Qty: 48 PCS; Revision: V1; ComponentLink1Description: Manufacturer URL; ComponentLink1URL: http://www.weidmueller.com/; ComponentLink2Description: URL Link1; ComponentLink2URL: http://catalog.weidmueller.com/catalog/Start.do?localeId=en&ObjectID=1048580000
footprint SV_7_62HP_90MSF_04 (OMNIMATE Power - Serie BV/SV 7.62HP  SV 7.62HP/04/90MSF3 3.5)
part A pins: A1
part B pins: A2
part C pins: A3
part D pins: A4

## 1049000000
designator J?
OMNIMATE Power - series BL/SL 7.62HP; PartNumber: 1049000000; Manufacturer: Weidmueller; Short_text_for_material: SL 7.62HP/08/180G 3.2SN BK BX; Side_termination_characteristic: closed side; Mounting_onto_the_PCB: Solder connection; Pitch_mm: 7.62 mm; Pitch_inch: 0.3 inch; No_of_poles: 8; Outgoing_elbow: 180°; Solder_pin_length_mm: 3.2 mm; Contact_material: Cu-Leg; Contact_surface: tinned; Insulating_material: PBT; UL_94_flammability_rating: V-0; Rated_voltage_for_surge_voltage_class_pollution_degree_II_2: 630 V; Rated_voltage_use_group_B_UL_1059: 300 V; Rated_current_use_group_B_UL_1059: 20 A; PackageReference: SL_7_62HP_180G_08; Colour: Black; Packaging: Box; Qty: 50 PCS; Revision: V1; ComponentLink1Description: Manufacturer URL; ComponentLink1URL: http://www.weidmueller.com/; ComponentLink2Description: URL Link1; ComponentLink2URL: http://catalog.weidmueller.com/catalog/Start.do?localeId=en&ObjectID=1049000000
footprint SL_7_62HP_180G_08 (OMNIMATE Power - Serie BL/SL 7.62HP  SL 7.62HP/08/180G 3.2)
pins: A1, A2, A3, A4, A5, A6, A7, A8

## 1049000000_Single
designator J?
OMNIMATE Power - series BL/SL 7.62HP; PartNumber: 1049000000; Manufacturer: Weidmueller; Short_text_for_material: SL 7.62HP/08/180G 3.2SN BK BX; Side_termination_characteristic: closed side; Mounting_onto_the_PCB: Solder connection; Pitch_mm: 7.62 mm; Pitch_inch: 0.3 inch; No_of_poles: 8; Outgoing_elbow: 180°; Solder_pin_length_mm: 3.2 mm; Contact_material: Cu-Leg; Contact_surface: tinned; Insulating_material: PBT; UL_94_flammability_rating: V-0; Rated_voltage_for_surge_voltage_class_pollution_degree_II_2: 630 V; Rated_voltage_use_group_B_UL_1059: 300 V; Rated_current_use_group_B_UL_1059: 20 A; PackageReference: SL_7_62HP_180G_08; Colour: Black; Packaging: Box; Qty: 50 PCS; Revision: V1; ComponentLink1Description: Manufacturer URL; ComponentLink1URL: http://www.weidmueller.com/; ComponentLink2Description: URL Link1; ComponentLink2URL: http://catalog.weidmueller.com/catalog/Start.do?localeId=en&ObjectID=1049000000
footprint SL_7_62HP_180G_08 (OMNIMATE Power - Serie BL/SL 7.62HP  SL 7.62HP/08/180G 3.2)
part A pins: A1
part B pins: A2
part C pins: A3
part D pins: A4
part E pins: A5
part F pins: A6
part G pins: A7
part H pins: A8

## 1059510000
designator J?
OMNIMATE Power - series BL/SL 7.62HP; PartNumber: 1059510000; Manufacturer: Weidmueller; Short_text_for_material: SL 7.62HP/08/90G 3.2SN BK BX; Side_termination_characteristic: closed side; Mounting_onto_the_PCB: Solder connection; Pitch_mm: 7.62 mm; Pitch_inch: 0.3 inch; No_of_poles: 8; Outgoing_elbow: 90°; Solder_pin_length_mm: 3.2 mm; Contact_material: Cu-Leg; Contact_surface: tinned; Insulating_material: PBT; UL_94_flammability_rating: V-0; Rated_voltage_for_surge_voltage_class_pollution_degree_II_2: 630 V; Rated_voltage_use_group_B_UL_1059: 300 V; Rated_current_use_group_B_UL_1059: 20 A; PackageReference: SL_7_62HP_90G_08; Colour: Black; Packaging: Box; Qty: 50 PCS; Revision: V1; ComponentLink1Description: Manufacturer URL; ComponentLink1URL: http://www.weidmueller.com/; ComponentLink2Description: URL Link1; ComponentLink2URL: http://catalog.weidmueller.com/catalog/Start.do?localeId=en&ObjectID=1059510000
footprint SL_7_62HP_90G_08 (OMNIMATE Power - Serie BL/SL 7.62HP  SL 7.62HP/08/90G 3.2)
pins: A1, A2, A3, A4, A5, A6, A7, A8